# Altium footprint library Horizont_11_12_2017.PcbLib: 257 footprints (part 10 of 17)
Each footprint in its own frame and in the unit in brackets; x right, y up, seen from the top. Pads: shape width x height; smd on the part's side, far side on the other; paste and mask are expansions set on the pad; w line width, h text height; cw(c..) or ccw(c..) is an arc to the next point about the centre after c.
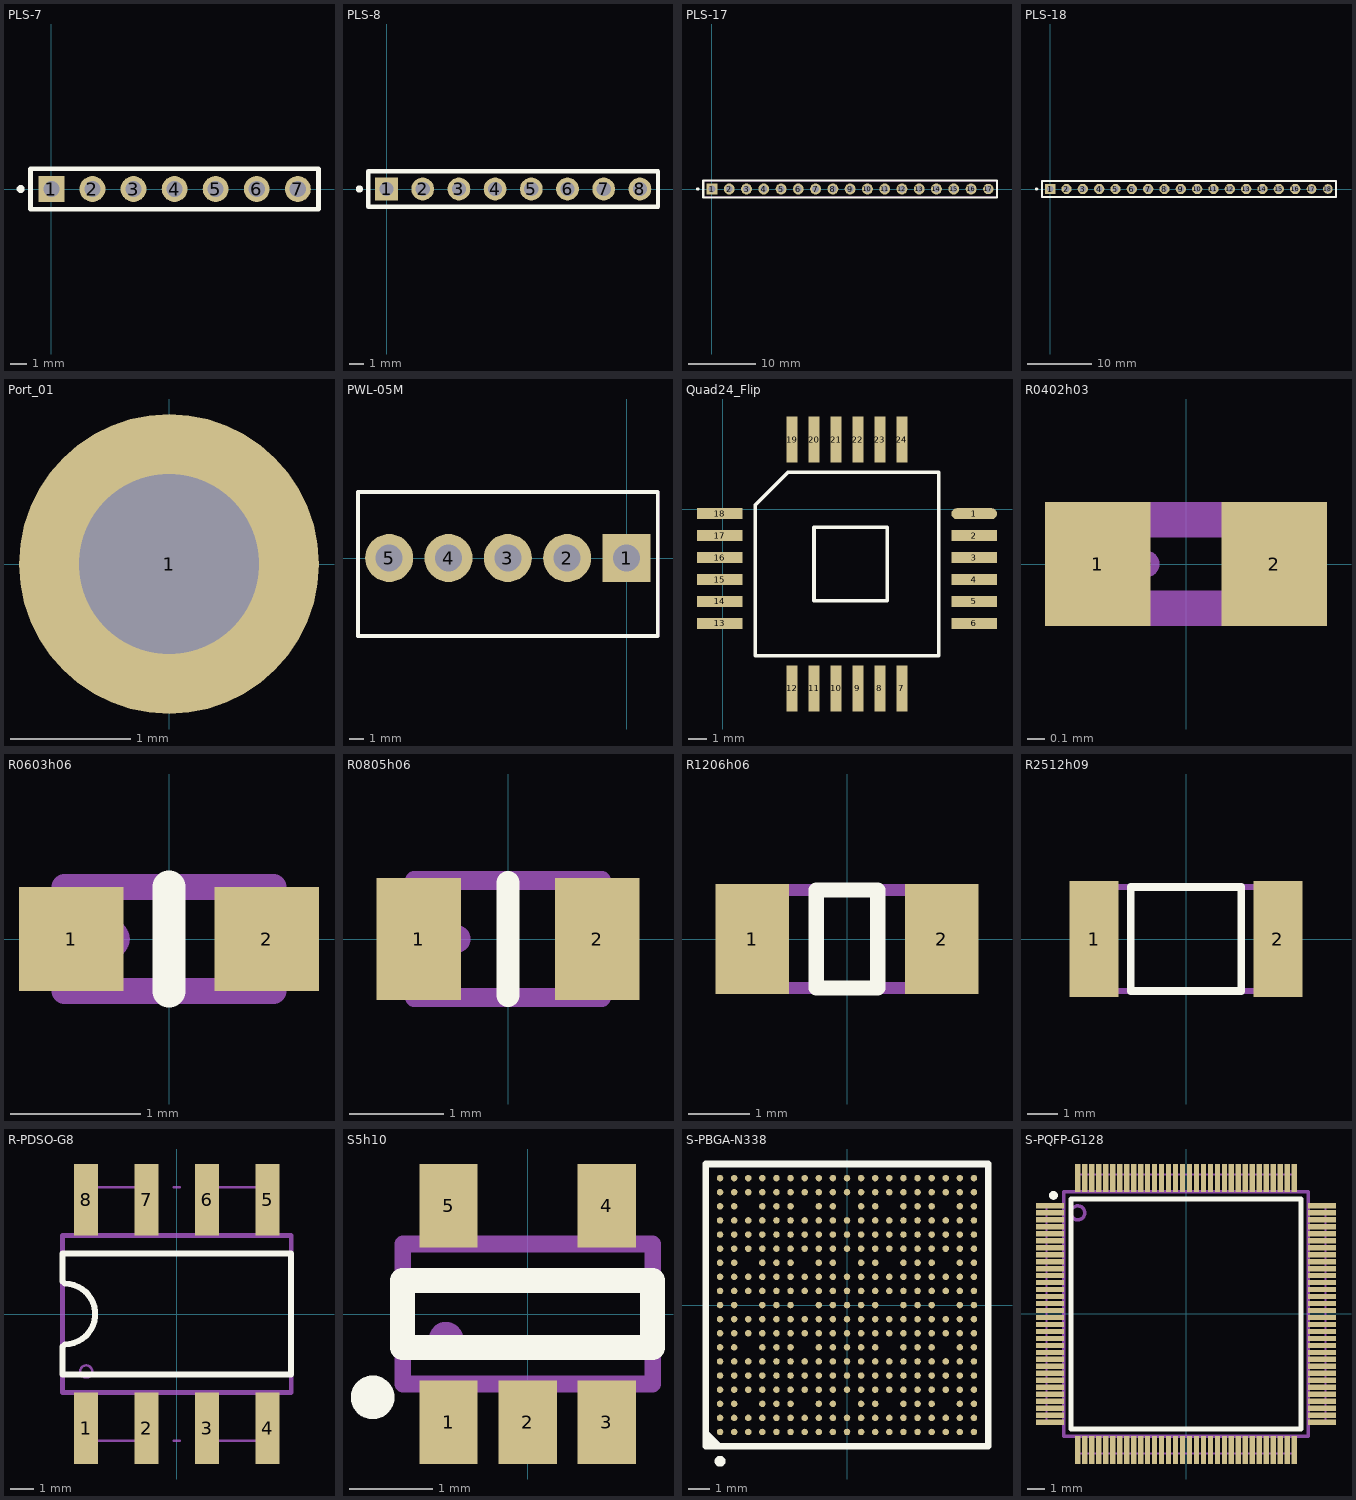
[diagram p9: the footprints below, top view; thin cyan lines are the x and y axes]

## PLS-7 [mm]
height 8.8
pads (7):
  rect 1.6x1.6 hole 1: 1(0,0)
  round 1.6 hole 1: 2(2.54,0) 3(5.08,0) 4(7.62,0) 5(10.16,0) 6(12.7,0) 7(15.24,0)
Top Overlay:
  circle w0.3: c-1.9,0 r0.1
  lines w0.3: -1.29,-1.25 -1.29,1.25 16.51,1.25 16.51,-1.25 -1.29,-1.25
Mechanical 1:
  lines w0.2: -1.29,-1.25 16.55,-1.25 16.55,1.25 -1.29,1.25 -1.29,-1.25
  text "1" at -0.254,-0.508 h1.5
  text "7" at 14.9,-0.45 h1.5
  text ".Designator" at 6.9,-0.2 h1.5
3D body "PLS-7.stp": height 10, standoff -3, extent -1.27,-1.27 16.51,1.27

## PLS-8 [mm]
height 8.8
pads (8):
  rect 1.6x1.6 hole 1: 1(0,0)
  round 1.6 hole 1: 2(2.54,0) 3(5.08,0) 4(7.62,0) 5(10.16,0) 6(12.7,0) 7(15.24,0) 8(17.78,0)
Top Overlay:
  circle w0.3: c-1.9,0 r0.1
  lines w0.3: -1.29,-1.25 -1.29,1.25 19.05,1.25 19.05,-1.25 -1.29,-1.25
Mechanical 1:
  lines w0.2: -1.29,-1.25 -1.29,1.25 19.05,1.25 19.05,-1.25 -1.29,-1.25
  text "1" at -0.254,-0.508 h1.5
  text "8" at 17.78,-0.635 h1.5
  text ".Designator" at 7.5,-0.4 h1.5
3D body "PLS-8.stp": height 10, standoff -3, extent -1.27,-1.27 19.05,1.27

## PLS-17 [mm]
height 8.8
pads (17):
  rect 1.6x1.6 hole 1: 1(0,0)
  round 1.6 hole 1: 2(2.54,0) 3(5.08,0) 4(7.62,0) 5(10.16,0) 6(12.7,0) 7(15.24,0) 8(17.78,0) 9(20.32,0) 10(22.86,0) 11(25.4,0) 12(27.94,0) 13(30.48,0) 14(33.02,0) 15(35.56,0) 16(38.1,0)
  round 1.524 hole 0.965: 17(40.64,0)
Top Overlay:
  circle w0.3: c-2.1,0 r0.1
  lines w0.3: -1.28,-1.25 -1.28,1.25 41.92,1.25 41.92,-1.25 -1.28,-1.25
Mechanical 1:
  lines w0.2: -1.28,-1.25 41.92,-1.25 41.92,1.25 -1.28,1.25 -1.28,-1.25
  text ".Designator" at 16.61,-0.22 h1.5
  text "17" at 40.116,-0.257 h1.5
  text "1" at -0.128,-0.257 h1.5
3D body "PLS-17.stp": height 10, standoff -3, extent -1.27,-1.27 41.91,1.27

## PLS-18 [mm]
height 8.8
pads (18):
  rect 1.6x1.6 hole 1: 1(0,0)
  round 1.6 hole 1: 2(2.54,0) 3(5.08,0) 4(7.62,0) 5(10.16,0) 6(12.7,0) 7(15.24,0) 8(17.78,0) 9(20.32,0) 10(22.86,0) 11(25.4,0) 12(27.94,0) 13(30.48,0) 14(33.02,0) 15(35.56,0) 16(38.1,0)
  round 1.524 hole 0.965: 17(40.64,0) 18(43.18,0)
Top Overlay:
  circle w0.3: c-2.1,0 r0.1
  lines w0.3: -1.28,-1.25 -1.28,1.25 44.45,1.25 44.45,-1.25 -1.28,-1.25
Mechanical 1:
  lines w0.2: -1.28,-1.25 44.45,-1.25 44.45,1.25 -1.28,1.25 -1.28,-1.25
  text ".Designator" at 16.61,-0.22 h1.5
  text "18" at 42.656,-0.257 h1.5
  text "1" at -0.128,-0.257 h1.5
3D body "PLS-18.stp": height 10, standoff -3, extent -1.27,-1.27 44.45,1.27

## Port_01 [mm]
pads (1):
  round 2.5 hole 1.5: 1(0,0)
Mechanical 1:
  text ".Designator" at -4.5,2.5 h1.5

## PWL-05M [mm]
height 13.8
pads (5):
  rect 3.2x3.2 hole 1.8: 1(0,0)
  round 3.2 hole 1.8: 2(-3.96,0) 3(-7.92,0) 4(-11.88,0) 5(-15.84,0)
Top Overlay:
  lines w0.25: -17.92,-5.2 2.08,-5.2 2.08,4.4 -17.92,4.4 -17.92,-5.2
Mechanical 1:
  lines w0.2: -17.92,-5.2 -17.92,4.4 2.1,4.4 2.1,-5.2 -17.92,-5.2
  text ".Designator" at -8,3.1 h1.5
  text "1" at 0,-0.5 h1.5
  text "5" at -16.12,-0.3 h1.5
3D body "PWL-05M.STEP": height 13.8, standoff -3.7, extent -17.92,-5.2 2.08,4.4

## Quad24_Flip [mm]
pads (24):
  oval 2.5x0.6 smd: 1(13.75,-0.25)
  rect 2.5x0.6 smd: 2(13.75,-1.45) 3(13.75,-2.65) 4(13.75,-3.85) 5(13.75,-5.05) 6(13.75,-6.25) 13(-0.15,-6.25) 14(-0.15,-5.05) 15(-0.15,-3.85) 16(-0.15,-2.65) 17(-0.15,-1.45) 18(-0.15,-0.25)
  rect 0.6x2.5 smd: 7(9.8,-9.8) 8(8.6,-9.8) 9(7.4,-9.8) 10(6.2,-9.8) 11(5,-9.8) 12(3.8,-9.8) 19(3.8,3.8) 20(5,3.8) 21(6.2,3.8) 22(7.4,3.8) 23(8.6,3.8) 24(9.8,3.8)
Top Overlay:
  lines w0.2: 1.785,-8.015 1.785,0.23 3.57,2.015 11.815,2.015 11.815,-8.015 1.785,-8.015 ; 5,-5 5,-1 9,-1 9,-5 5,-5

## R0402h03 [mm]
height 0.3
pads (2):
  rect 0.6x0.7 smd: 1(-0.5,0) 2(0.5,0)
Mechanical 1:
  circle w0.05: c-0.225,0 r0.05
  lines w0.2: -0.5,-0.25 -0.5,0.25 0.5,0.25 0.5,-0.25 -0.5,-0.25
  text ".Designator" at -0.72,0.7 h1.5
3D body "R0402h03.stp": height 0.3, standoff 0, extent -0.6,-0.35 0.6,0.35

## R0603h06 [mm]
height 0.6
pads (2):
  rect 0.8x0.8 smd: 1(-0.75,0) 2(0.75,0)
Top Overlay:
  lines w0.25: 0,-0.4 0,0.4
Mechanical 1:
  circle w0.1: c-0.45,0 r0.1
  lines w0.2: -0.8,-0.4 0.8,-0.4 0.8,0.4 -0.8,0.4 -0.8,-0.4
  text ".Designator" at -0.9,0.7 h1.5
3D body "R0603h06.stp": height 0.6, standoff 0, extent -0.85,-0.45 0.85,0.45

## R0805h06 [mm]
height 0.6
pads (2):
  rect 0.9x1.3 smd: 1(-0.95,0) 2(0.95,0)
Top Overlay:
  lines w0.25: 0,-0.6 0,0.6
Mechanical 1:
  circle w0.1: c-0.55,0 r0.1
  lines w0.2: -1,-0.625 -1,0.625 1,0.625 1,-0.625 -1,-0.625
  text ".Designator" at -1,1 h1.5
3D body "R0805h06.stp": height 0.6, standoff 0, extent -1.05,-0.675 1.05,0.675

## R1206h06 [mm]
height 0.6
pads (2):
  rect 1.2x1.8 smd: 1(-1.55,0) 2(1.55,0)
Top Overlay:
  lines w0.25: -0.5,-0.8 0.5,-0.8 0.5,0.8 -0.5,0.8 -0.5,-0.8
Mechanical 1:
  circle w0.1: c-1.1,0 r0.1
  lines w0.2: -1.6,-0.8 1.6,-0.8 1.6,0.8 -1.6,0.8 -1.6,-0.8
  text ".Designator" at -1.2,1.3 h1.5
3D body "R1206h06.stp": height 0.6, standoff 0, extent -1.675,-0.9 1.675,0.9

## R2512h09 [mm]
height 0.9
pads (2):
  rect 1.6x3.8 smd: 1(-3,0) 2(3,0)
Top Overlay:
  lines w0.25: -1.8,-1.7 1.8,-1.7 1.8,1.7 -1.8,1.7 -1.8,-1.7
Mechanical 1:
  circle w0.1: c-2.775,0 r0.1
  lines w0.2: -3.3,-1.7 -3.3,1.7 3.3,1.7 3.3,-1.7 -3.3,-1.7
  text ".Designator" at -1.3,2.3 h1.5
3D body "R2512h09.stp": height 0.9, standoff 0, extent -3.3,-1.7 3.3,1.7

## R-PDSO-G8 [mm]
height 4.85
pads (8):
  rect 1x3 smd: 1(-3.81,-4.8) 2(-1.27,-4.8) 3(1.27,-4.8) 4(3.81,-4.8) 5(3.81,4.8) 6(1.27,4.8) 7(-1.27,4.8) 8(-3.81,4.8)
Top Overlay:
  lines w0.25: -4.8,-2.54 4.8,-2.54 4.8,2.54 -4.8,2.54 -4.8,1.371 -4.699,1.27 cw(c-4.699,0) -4.699,-1.27 -4.8,-1.371 -4.8,-2.54
Mechanical 1:
  circle w0.1: c-3.81,-2.413 r0.254
  lines w0.1: -3.81,-5.328 -1.27,-5.328 ; -3.81,5.328 -1.27,5.328 ; -0.127,-5.328 0.127,-5.328 ; -0.127,5.328 0.127,5.328 ; 1.27,-5.328 3.81,-5.328 ; 1.27,5.328 3.81,5.328
  lines w0.2: -4.699,-1.27 ccw(c-4.699,0) -4.699,1.27 ; -3.81,-5.328 -3.81,-3.3 ; -3.81,3.3 -3.81,5.328 ; 3.81,-5.328 3.81,-3.3 ; 3.81,3.3 3.81,5.328 ; -4.8,-3.3 4.8,-3.3 4.8,3.3 -4.8,3.3 -4.8,-3.3
  text "8" at -4,1.75 h1.5
  text ".Designator" at -1.625,1.25 h1.5
  text ".Comment" at -1.905,-1.115 h1.5
3D body "R-PDSO-G8.STEP": height 4.85, standoff 0, extent -4.8,-5.35 4.8,5.35

## S5h10 [mm]
height 1
pads (5):
  rect 0.7x1 smd: 1(-0.95,-1.3) 2(0,-1.3) 3(0.95,-1.3) 4(0.95,1.3) 5(-0.95,1.3)
Top Overlay:
  circle w0.3: c-1.862,-1 r0.112
  lines w0.3: -1.5,-0.4 1.5,-0.4 1.5,0.4 -1.5,0.4 -1.5,-0.4
Mechanical 1:
  circle w0.25: c-0.98,-0.3 r0.08
  lines w0.2: -0.95,-1.5 -0.95,-0.85 ; -0.95,0.85 -0.95,1.5 ; 0.95,-1.5 0.95,-0.84 ; 0.95,0.85 0.95,1.5 ; -1.5,-0.84 -1.5,0.84 1.5,0.84 1.5,-0.84 -1.5,-0.84 ; 0,-1.5 0,-0.85 0,-1.5
  text "5" at -2.05,1.05 h1.5
  text ".Comment" at -2.67,-2.74 h1.5
  text ".Designator" at -0.97,1.86 h1.5
3D body "S5h10.stp": height 1.01, standoff 0, extent -1.45,-1.5 1.45,1.5

## S-PBGA-N338 [mm]
height 1.3
pads (338):
  round 0.3 smd: A1(-5.85,-5.85) A2(-5.85,-5.2) A3(-5.85,-4.55) A4(-5.85,-3.9) A5(-5.85,-3.25) A6(-5.85,-2.6) A7(-5.85,-1.95) A8(-5.85,-1.3) A9(-5.85,-0.65) A10(-5.85,0) A11(-5.85,0.65) A12(-5.85,1.3) A13(-5.85,1.95) A14(-5.85,2.6) A15(-5.85,3.25) A16(-5.85,3.9) A17(-5.85,4.55) A18(-5.85,5.2) A19(-5.85,5.85) B1(-5.2,-5.85) B2(-5.2,-5.2) B3(-5.2,-4.55) B4(-5.2,-3.9) B5(-5.2,-3.25) B6(-5.2,-2.6) B7(-5.2,-1.95) B8(-5.2,-1.3) B9(-5.2,-0.65) B10(-5.2,0) B11(-5.2,0.65) B12(-5.2,1.3) B13(-5.2,1.95) B14(-5.2,2.6) B15(-5.2,3.25) B16(-5.2,3.9) B17(-5.2,4.55) B18(-5.2,5.2) B19(-5.2,5.85) C1(-4.55,-5.85) C2(-4.55,-5.2) C4(-4.55,-3.9) C5(-4.55,-3.25) C6(-4.55,-2.6) C8(-4.55,-1.3) C9(-4.55,-0.65) C11(-4.55,0.65) C12(-4.55,1.3) C14(-4.55,2.6) C15(-4.55,3.25) C16(-4.55,3.9) C18(-4.55,5.2) C19(-4.55,5.85) D1(-3.9,-5.85) D2(-3.9,-5.2) D3(-3.9,-4.55) D4(-3.9,-3.9) D5(-3.9,-3.25) D6(-3.9,-2.6) D7(-3.9,-1.95) D8(-3.9,-1.3) D9(-3.9,-0.65) D10(-3.9,0) D11(-3.9,0.65) D12(-3.9,1.3) D13(-3.9,1.95) D14(-3.9,2.6) D15(-3.9,3.25) D16(-3.9,3.9) D17(-3.9,4.55) D18(-3.9,5.2) D19(-3.9,5.85) E1(-3.25,-5.85) E2(-3.25,-5.2) E3(-3.25,-4.55) E4(-3.25,-3.9) E5(-3.25,-3.25) E6(-3.25,-2.6) E7(-3.25,-1.95) E8(-3.25,-1.3) E9(-3.25,-0.65) E10(-3.25,0) E11(-3.25,0.65) E12(-3.25,1.3) E13(-3.25,1.95) E14(-3.25,2.6) E15(-3.25,3.25) E16(-3.25,3.9) E17(-3.25,4.55) E18(-3.25,5.2) E19(-3.25,5.85) F1(-2.6,-5.85) F2(-2.6,-5.2) F3(-2.6,-4.55) F4(-2.6,-3.9) F5(-2.6,-3.25) F6(-2.6,-2.6) F7(-2.6,-1.95) F8(-2.6,-1.3) F9(-2.6,-0.65) F10(-2.6,0) F11(-2.6,0.65) F12(-2.6,1.3) F13(-2.6,1.95) F14(-2.6,2.6) F15(-2.6,3.25) F16(-2.6,3.9) F17(-2.6,4.55) F18(-2.6,5.2) F19(-2.6,5.85) G1(-1.95,-5.85) G2(-1.95,-5.2) G4(-1.95,-3.9) G5(-1.95,-3.25) G6(-1.95,-2.6) G8(-1.95,-1.3) G9(-1.95,-0.65) G11(-1.95,0.65) G12(-1.95,1.3) G14(-1.95,2.6) G15(-1.95,3.25) G16(-1.95,3.9) G18(-1.95,5.2) G19(-1.95,5.85) H1(-1.3,-5.85) H2(-1.3,-5.2) H3(-1.3,-4.55) H4(-1.3,-3.9) H5(-1.3,-3.25) H6(-1.3,-2.6) H7(-1.3,-1.95) H8(-1.3,-1.3) H9(-1.3,-0.65) H10(-1.3,0) H11(-1.3,0.65) H12(-1.3,1.3) H13(-1.3,1.95) H14(-1.3,2.6) H15(-1.3,3.25) H16(-1.3,3.9) H17(-1.3,4.55) H18(-1.3,5.2) H19(-1.3,5.85) J1(-0.65,-5.85) J2(-0.65,-5.2) J3(-0.65,-4.55) J4(-0.65,-3.9) J5(-0.65,-3.25) J6(-0.65,-2.6) J7(-0.65,-1.95) J8(-0.65,-1.3) J9(-0.65,-0.65) J10(-0.65,0) J11(-0.65,0.65) J12(-0.65,1.3) J13(-0.65,1.95) J14(-0.65,2.6) J15(-0.65,3.25) J16(-0.65,3.9) J17(-0.65,4.55) J18(-0.65,5.2) J19(-0.65,5.85) K1(0,-5.85) K2(0,-5.2) K4(0,-3.9) K5(0,-3.25) K6(0,-2.6) K7(0,-1.95) K8(0,-1.3) K9(0,-0.65) K10(0,0) K11(0,0.65) K12(0,1.3) K14(0,2.6) K15(0,3.25) K16(0,3.9) K18(0,5.2) K19(0,5.85) L1(0.65,-5.85) L2(0.65,-5.2) L3(0.65,-4.55) L4(0.65,-3.9) L5(0.65,-3.25) L6(0.65,-2.6) L7(0.65,-1.95) L8(0.65,-1.3) L9(0.65,-0.65) L10(0.65,0) L11(0.65,0.65) L12(0.65,1.3) L13(0.65,1.95) L14(0.65,2.6) L15(0.65,3.25) L16(0.65,3.9) L17(0.65,4.55) L18(0.65,5.2) L19(0.65,5.85) M1(1.3,-5.85) M2(1.3,-5.2) M3(1.3,-4.55) M4(1.3,-3.9) M5(1.3,-3.25) M6(1.3,-2.6) M7(1.3,-1.95) M8(1.3,-1.3) M9(1.3,-0.65) M10(1.3,0) M11(1.3,0.65) M12(1.3,1.3) M13(1.3,1.95) M14(1.3,2.6) M15(1.3,3.25) M16(1.3,3.9) M17(1.3,4.55) M18(1.3,5.2) M19(1.3,5.85) N1(1.95,-5.85) N2(1.95,-5.2) N4(1.95,-3.9) N5(1.95,-3.25) N6(1.95,-2.6) N8(1.95,-1.3) N9(1.95,-0.65) N11(1.95,0.65) N12(1.95,1.3) N14(1.95,2.6) N15(1.95,3.25) N16(1.95,3.9) N18(1.95,5.2) N19(1.95,5.85) P1(2.6,-5.85) P2(2.6,-5.2) P3(2.6,-4.55) P4(2.6,-3.9) P5(2.6,-3.25) P6(2.6,-2.6) P7(2.6,-1.95) P8(2.6,-1.3) P9(2.6,-0.65) P10(2.6,0) P11(2.6,0.65) P12(2.6,1.3) P13(2.6,1.95) P14(2.6,2.6) P15(2.6,3.25) P16(2.6,3.9) P17(2.6,4.55) P18(2.6,5.2) P19(2.6,5.85) R1(3.25,-5.85) R2(3.25,-5.2) R3(3.25,-4.55) R4(3.25,-3.9) R5(3.25,-3.25) R6(3.25,-2.6) R7(3.25,-1.95) R8(3.25,-1.3) R9(3.25,-0.65) R10(3.25,0) R11(3.25,0.65) R12(3.25,1.3) R13(3.25,1.95) R14(3.25,2.6) R15(3.25,3.25) R16(3.25,3.9) R17(3.25,4.55) R18(3.25,5.2) R19(3.25,5.85) T1(3.9,-5.85) T2(3.9,-5.2) T3(3.9,-4.55) T4(3.9,-3.9) T5(3.9,-3.25) T6(3.9,-2.6) T7(3.9,-1.95) T8(3.9,-1.3) T9(3.9,-0.65) T10(3.9,0) T11(3.9,0.65) T12(3.9,1.3) T13(3.9,1.95) T14(3.9,2.6) T15(3.9,3.25) T16(3.9,3.9) T17(3.9,4.55) T18(3.9,5.2) T19(3.9,5.85) U1(4.55,-5.85) U2(4.55,-5.2) U4(4.55,-3.9) U5(4.55,-3.25) U6(4.55,-2.6) U8(4.55,-1.3) U9(4.55,-0.65) U11(4.55,0.65) U12(4.55,1.3) U14(4.55,2.6) U15(4.55,3.25) U16(4.55,3.9) U18(4.55,5.2) U19(4.55,5.85) V1(5.2,-5.85) V2(5.2,-5.2) V3(5.2,-4.55) V4(5.2,-3.9) V5(5.2,-3.25) V6(5.2,-2.6) V7(5.2,-1.95) V8(5.2,-1.3) V9(5.2,-0.65) V10(5.2,0) V11(5.2,0.65) V12(5.2,1.3) V13(5.2,1.95) V14(5.2,2.6) V15(5.2,3.25) V16(5.2,3.9) V17(5.2,4.55) V18(5.2,5.2) V19(5.2,5.85) W1(5.85,-5.85) W2(5.85,-5.2) W3(5.85,-4.55) W4(5.85,-3.9) W5(5.85,-3.25) W6(5.85,-2.6) W7(5.85,-1.95) W8(5.85,-1.3) W9(5.85,-0.65) W10(5.85,0) W11(5.85,0.65) W12(5.85,1.3) W13(5.85,1.95) W14(5.85,2.6) W15(5.85,3.25) W16(5.85,3.9) W17(5.85,4.55) W18(5.85,5.2) W19(5.85,5.85)
Top Overlay:
  circle w0.25: c-5.85,-7.2 r0.125
  region: -6.5,-5.907 -5.907,-6.5 -6.5,-6.5
  lines w0.3: -6.5,-5.907 -5.907,-6.5 ; -6.5,-6.5 -6.5,6.5 6.5,6.5 6.5,-6.5 -6.5,-6.5
Mechanical 1:
  lines w0.2: -6.5,-6.5 -6.5,6.5 6.5,6.5 6.5,-6.5 -6.5,-6.5
  text ".Designator" at -1.61,-0.22 h1.5
  text "19" at -6.25,5.25 h1.5
  text "1" at -6,-5.25 h1.5
  text "A" at -6,-6.25 h1.5
  text "W" at 5,-6.25 h1.5
3D body: height 1.3, standoff 0.23, extent -6.5,-6.5 6.5,6.5

## S-PQFP-G128 [mm]
height 1.45
pads (128):
  rect 1.6x0.3 smd: 1(-7.8,6.2) 2(-7.8,5.8) 3(-7.8,5.4) 4(-7.8,5) 5(-7.8,4.6) 6(-7.8,4.2) 7(-7.8,3.8) 8(-7.8,3.4) 9(-7.8,3) 10(-7.8,2.6) 11(-7.8,2.2) 12(-7.8,1.8) 13(-7.8,1.4) 14(-7.8,1) 15(-7.8,0.6) 16(-7.8,0.2) 17(-7.8,-0.2) 18(-7.8,-0.6) 19(-7.8,-1) 20(-7.8,-1.4) 21(-7.8,-1.8) 22(-7.8,-2.2) 23(-7.8,-2.6) 24(-7.8,-3) 25(-7.8,-3.4) 26(-7.8,-3.8) 27(-7.8,-4.2) 28(-7.8,-4.6) 29(-7.8,-5) 30(-7.8,-5.4) 31(-7.8,-5.8) 32(-7.8,-6.2) 65(7.8,-6.2) 66(7.8,-5.8) 67(7.8,-5.4) 68(7.8,-5) 69(7.8,-4.6) 70(7.8,-4.2) 71(7.8,-3.8) 72(7.8,-3.4) 73(7.8,-3) 74(7.8,-2.6) 75(7.8,-2.2) 76(7.8,-1.8) 77(7.8,-1.4) 78(7.8,-1) 79(7.8,-0.6) 80(7.8,-0.2) 81(7.8,0.2) 82(7.8,0.6) 83(7.8,1) 84(7.8,1.4) 85(7.8,1.8) 86(7.8,2.2) 87(7.8,2.6) 88(7.8,3) 89(7.8,3.4) 90(7.8,3.8) 91(7.8,4.2) 92(7.8,4.6) 93(7.8,5) 94(7.8,5.4) 95(7.8,5.8) 96(7.8,6.2)
  rect 0.3x1.6 smd: 33(-6.2,-7.8) 34(-5.8,-7.8) 35(-5.4,-7.8) 36(-5,-7.8) 37(-4.6,-7.8) 38(-4.2,-7.8) 39(-3.8,-7.8) 40(-3.4,-7.8) 41(-3,-7.8) 42(-2.6,-7.8) 43(-2.2,-7.8) 44(-1.8,-7.8) 45(-1.4,-7.8) 46(-1,-7.8) 47(-0.6,-7.8) 48(-0.2,-7.8) 49(0.2,-7.8) 50(0.6,-7.8) 51(1,-7.8) 52(1.4,-7.8) 53(1.8,-7.8) 54(2.2,-7.8) 55(2.6,-7.8) 56(3,-7.8) 57(3.4,-7.8) 58(3.8,-7.8) 59(4.2,-7.8) 60(4.6,-7.8) 61(5,-7.8) 62(5.4,-7.8) 63(5.8,-7.8) 64(6.2,-7.8) 97(6.2,7.8) 98(5.8,7.8) 99(5.4,7.8) 100(5,7.8) 101(4.6,7.8) 102(4.2,7.8) 103(3.8,7.8) 104(3.4,7.8) 105(3,7.8) 106(2.6,7.8) 107(2.2,7.8) 108(1.8,7.8) 109(1.4,7.8) 110(1,7.8) 111(0.6,7.8) 112(0.2,7.8) 113(-0.2,7.8) 114(-0.6,7.8) 115(-1,7.8) 116(-1.4,7.8) 117(-1.8,7.8) 118(-2.2,7.8) 119(-2.6,7.8) 120(-3,7.8) 121(-3.4,7.8) 122(-3.8,7.8) 123(-4.2,7.8) 124(-4.6,7.8) 125(-5,7.8) 126(-5.4,7.8) 127(-5.8,7.8) 128(-6.2,7.8)
Top Overlay:
  circle w0.3: c-7.6,6.8 r0.1
  lines w0.3: -6.6,-6.6 -6.6,6.6 6.6,6.6 6.6,-6.6 -6.6,-6.6
Mechanical 1:
  circle w0.2: c-6.2,5.8 r0.4
  lines w0.1: -7,-6.2 -8,-6.2 -8,6.2 -7,6.2 ; -6.2,-7 -6.2,-8 6.2,-8 6.2,-7 ; -6.2,7 -6.2,8 6.2,8 6.2,7 ; 7,-6.2 8,-6.2 8,6.2 7,6.2
  lines w0.2: -7,-7 -7,7 7,7 7,-7 -7,-7
  text "128" at -5.1,5.2 h1.5
  text ".Comment" at -2.7,-1.42 h1.5
  text ".Designator" at -1.11,0.28 h1.5
3D body "S-PQFP-G128h1_45.stp": height 1.47, standoff 0, extent -8,-8 8,8